# Altium footprint library lib_datalogger.PcbLib: 866 footprints (part 19 of 55)
Each footprint in its own frame and in the unit in brackets; x right, y up, seen from the top. Pads: shape width x height; smd on the part's side, far side on the other; paste and mask are expansions set on the pad; w line width, h text height; cw(c..) or ccw(c..) is an arc to the next point about the centre after c.
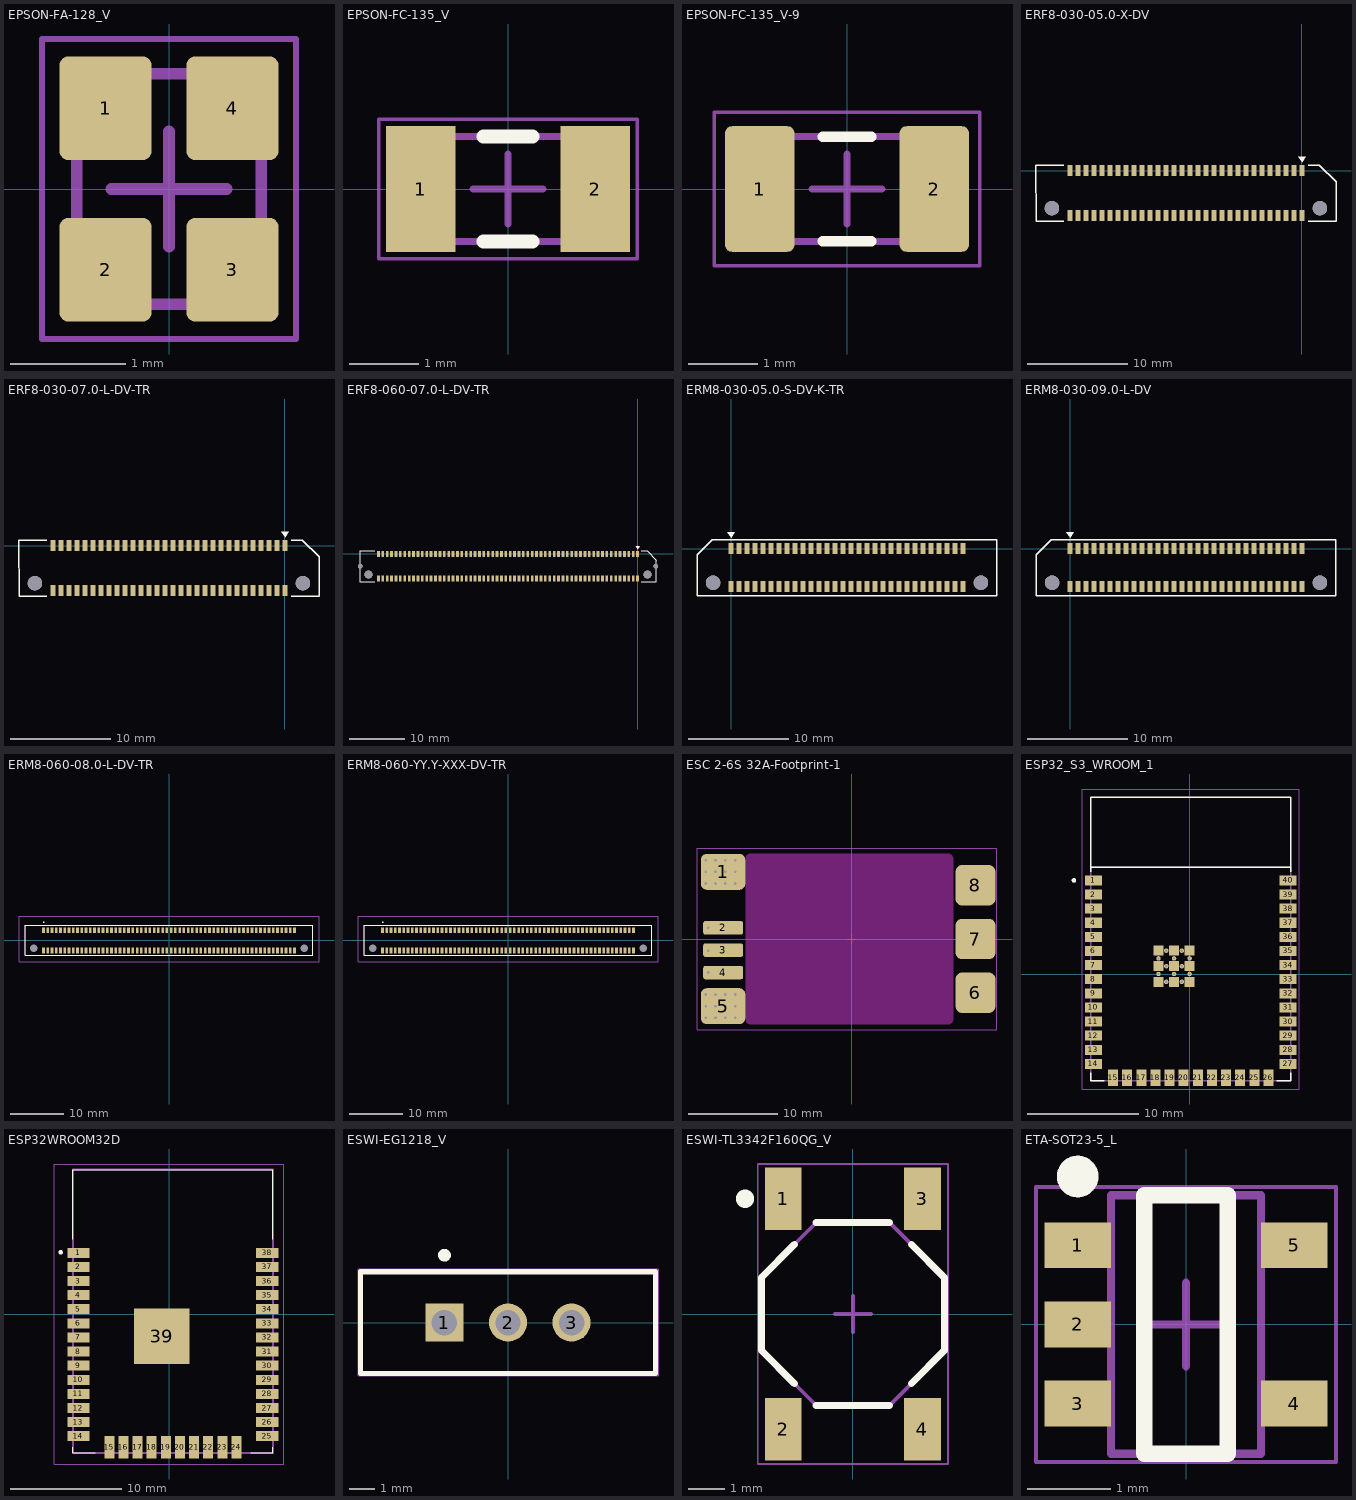
[diagram p18: the footprints below, top view; thin cyan lines are the x and y axes]

## EPSON-FA-128_V [mm] "SMD, 4-Leads, Body 2x1.6mm, Pitch 1.45mm"
height 0.5
pads (4):
  rrect20% 0.8x0.9 smd: 1(-0.55,0.7) 2(-0.55,-0.7) 3(0.55,-0.7) 4(0.55,0.7)
Mechanical 13:
  lines w0.1: -0.8,0.7 -0.5,1 ; -0.8,-1 0.8,-1 0.8,1 -0.8,1 -0.8,-1
Mechanical 15:
  lines w0.05: -1.1,-1.3 -1.1,1.3 1.1,1.3 1.1,-1.3 -1.1,-1.3
  lines w0.1: -0.5,0 0.5,0 ; 0,-0.5 0,0.5
Top Designator:
  text ".Designator" at -1.27,-0.127 h0.6
3D body "CX2016DB16000D0GPSC1.STEP": height 0.4, standoff 0, extent -0.8,-1 0.8,1

## EPSON-FC-135_V [mm] "SMD, 2-Leads, Body 3.2x1.5mm"
height 0.9
pads (2):
  rect 1x1.8 smd: 1(-1.25,0) 2(1.25,0)
Top Overlay:
  lines w0.2: -0.35,-0.75 0.35,-0.75 ; -0.35,0.75 0.35,0.75
Mechanical 13:
  lines w0.1: -1.6,-0.75 -1.6,0.75 1.6,0.75 1.6,-0.75 -1.6,-0.75
Mechanical 15:
  lines w0.05: -1.85,-1 -1.85,1 1.85,1 1.85,-1 -1.85,-1
  lines w0.1: -0.5,0 0.5,0 ; 0,-0.5 0,0.5
3D body: height 0.7, standoff 0, extent -1.6,-0.75 1.6,0.75
3D body: height 0.9, standoff 0, extent -1.45,-0.75 1.45,0.75

## EPSON-FC-135_V-9 [mm] "SMD, 2-Leads, Body 3.2x1.5mm"
height 0.9
pads (2):
  rrect20% 1x1.8 smd: 1(-1.25,0) 2(1.25,0)
Top Overlay:
  lines w0.15: -0.35,-0.75 0.35,-0.75 ; -0.35,0.75 0.35,0.75
Mechanical 13:
  lines w0.1: -1.6,-0.75 -1.6,0.75 1.6,0.75 1.6,-0.75 -1.6,-0.75
Mechanical 15:
  lines w0.05: -1.9,-1.1 1.9,-1.1 1.9,1.1 -1.9,1.1 -1.9,-1.1
  lines w0.1: -0.5,0 0.5,0 ; 0,-0.5 0,0.5
Top Designator:
  text ".Designator" at -1.27,-0.127 h0.6
3D body: height 0.7, standoff 0, extent -1.6,-0.75 1.6,0.75
3D body: height 0.9, standoff 0, extent -1.45,-0.75 1.45,0.75

## ERF8-030-05.0-X-DV [mm]
pads (62):
  rect 0.5x1.1 smd: 1(0,0) 2(0,-4.5) 3(-0.8,0) 4(-0.8,-4.5) 5(-1.6,0) 6(-1.6,-4.5) 7(-2.4,0) 8(-2.4,-4.5) 9(-3.2,0) 10(-3.2,-4.5) 11(-4,0) 12(-4,-4.5) 13(-4.8,0) 14(-4.8,-4.5) 15(-5.6,0) 16(-5.6,-4.5) 17(-6.4,0) 18(-6.4,-4.5) 19(-7.2,0) 20(-7.2,-4.5) 21(-8,0) 22(-8,-4.5) 23(-8.8,0) 24(-8.8,-4.5) 25(-9.6,0) 26(-9.6,-4.5) 27(-10.4,0) 28(-10.4,-4.5) 29(-11.2,0) 30(-11.2,-4.5) 31(-12,0) 32(-12,-4.5) 33(-12.8,0) 34(-12.8,-4.5) 35(-13.6,0) 36(-13.6,-4.5) 37(-14.4,0) 38(-14.4,-4.5) 39(-15.2,0) 40(-15.2,-4.5) 41(-16,0) 42(-16,-4.5) 43(-16.8,0) 44(-16.8,-4.5) 45(-17.6,0) 46(-17.6,-4.5) 47(-18.4,0) 48(-18.4,-4.5) 49(-19.2,0) 50(-19.2,-4.5) 51(-20,0) 52(-20,-4.5) 53(-20.8,0) 54(-20.8,-4.5) 55(-21.6,0) 56(-21.6,-4.5) 57(-22.4,0) 58(-22.4,-4.5) 59(-23.2,0) 60(-23.2,-4.5)
  round 1.45 hole 1.45 unplated: HOLE(-25,-3.75) HOLE(1.8,-3.75)
Top Overlay:
  region: 0.009,0.846 -0.379,1.389 0.397,1.389
  lines w0.127: -23.837,-5.05 -26.6,-5.05 -26.6,0.55 -23.838,0.55 ; 0.638,-5.05 3.4,-5.05 3.4,-1.107 1.743,0.55 0.638,0.55
3D body "Samtec-ERF8-030-05-L-DV.step": height 5.33, standoff -1.04, extent -26.6,-5.05 3.4,0.55

## ERF8-030-07.0-L-DV-TR [mm]
pads (62):
  rect 0.5x1.1 smd: 1(0,0) 2(0,-4.5) 3(-0.8,0) 4(-0.8,-4.5) 5(-1.6,0) 6(-1.6,-4.5) 7(-2.4,0) 8(-2.4,-4.5) 9(-3.2,0) 10(-3.2,-4.5) 11(-4,0) 12(-4,-4.5) 13(-4.8,0) 14(-4.8,-4.5) 15(-5.6,0) 16(-5.6,-4.5) 17(-6.4,0) 18(-6.4,-4.5) 19(-7.2,0) 20(-7.2,-4.5) 21(-8,0) 22(-8,-4.5) 23(-8.8,0) 24(-8.8,-4.5) 25(-9.6,0) 26(-9.6,-4.5) 27(-10.4,0) 28(-10.4,-4.5) 29(-11.2,0) 30(-11.2,-4.5) 31(-12,0) 32(-12,-4.5) 33(-12.8,0) 34(-12.8,-4.5) 35(-13.6,0) 36(-13.6,-4.5) 37(-14.4,0) 38(-14.4,-4.5) 39(-15.2,0) 40(-15.2,-4.5) 41(-16,0) 42(-16,-4.5) 43(-16.8,0) 44(-16.8,-4.5) 45(-17.6,0) 46(-17.6,-4.5) 47(-18.4,0) 48(-18.4,-4.5) 49(-19.2,0) 50(-19.2,-4.5) 51(-20,0) 52(-20,-4.5) 53(-20.8,0) 54(-20.8,-4.5) 55(-21.6,0) 56(-21.6,-4.5) 57(-22.4,0) 58(-22.4,-4.5) 59(-23.2,0) 60(-23.2,-4.5)
  round 1.45 hole 1.45 unplated: HOLE(-25,-3.75) HOLE(1.8,-3.75)
Top Overlay:
  region: 0.009,0.846 -0.379,1.389 0.397,1.389
  lines w0.127: -23.837,-5.05 -26.6,-5.05 -26.6,0.55 -23.838,0.55 ; 0.638,-5.05 3.4,-5.05 3.4,-1.107 1.743,0.55 0.638,0.55
3D body "Samtec-ERF8-030-07-L-DV.step": height 7.24, standoff -1.03, extent -26.651,-5.05 3.349,0.55

## ERF8-060-07.0-L-DV-TR [mm]
pads (124):
  rect 0.5x1.1 smd: 1(0,0) 2(0,-4.5) 3(-0.8,0) 4(-0.8,-4.5) 5(-1.6,0) 6(-1.6,-4.5) 7(-2.4,0) 8(-2.4,-4.5) 9(-3.2,0) 10(-3.2,-4.5) 11(-4,0) 12(-4,-4.5) 13(-4.8,0) 14(-4.8,-4.5) 15(-5.6,0) 16(-5.6,-4.5) 17(-6.4,0) 18(-6.4,-4.5) 19(-7.2,0) 20(-7.2,-4.5) 21(-8,0) 22(-8,-4.5) 23(-8.8,0) 24(-8.8,-4.5) 25(-9.6,0) 26(-9.6,-4.5) 27(-10.4,0) 28(-10.4,-4.5) 29(-11.2,0) 30(-11.2,-4.5) 31(-12,0) 32(-12,-4.5) 33(-12.8,0) 34(-12.8,-4.5) 35(-13.6,0) 36(-13.6,-4.5) 37(-14.4,0) 38(-14.4,-4.5) 39(-15.2,0) 40(-15.2,-4.5) 41(-16,0) 42(-16,-4.5) 43(-16.8,0) 44(-16.8,-4.5) 45(-17.6,0) 46(-17.6,-4.5) 47(-18.4,0) 48(-18.4,-4.5) 49(-19.2,0) 50(-19.2,-4.5) 51(-20,0) 52(-20,-4.5) 53(-20.8,0) 54(-20.8,-4.5) 55(-21.6,0) 56(-21.6,-4.5) 57(-22.4,0) 58(-22.4,-4.5) 59(-23.2,0) 60(-23.2,-4.5) 61(-24,0) 62(-24,-4.5) 63(-24.8,0) 64(-24.8,-4.5) 65(-25.6,0) 66(-25.6,-4.5) 67(-26.4,0) 68(-26.4,-4.5) 69(-27.2,0) 70(-27.2,-4.5) 71(-28,0) 72(-28,-4.5) 73(-28.8,0) 74(-28.8,-4.5) 75(-29.6,0) 76(-29.6,-4.5) 77(-30.4,0) 78(-30.4,-4.5) 79(-31.2,0) 80(-31.2,-4.5) 81(-32,0) 82(-32,-4.5) 83(-32.8,0) 84(-32.8,-4.5) 85(-33.6,0) 86(-33.6,-4.5) 87(-34.4,0) 88(-34.4,-4.5) 89(-35.2,0) 90(-35.2,-4.5) 91(-36,0) 92(-36,-4.5) 93(-36.8,0) 94(-36.8,-4.5) 95(-37.6,0) 96(-37.6,-4.5) 97(-38.4,0) 98(-38.4,-4.5) 99(-39.2,0) 100(-39.2,-4.5) 101(-40,0) 102(-40,-4.5) 103(-40.8,0) 104(-40.8,-4.5) 105(-41.6,0) 106(-41.6,-4.5) 107(-42.4,0) 108(-42.4,-4.5) 109(-43.2,0) 110(-43.2,-4.5) 111(-44,0) 112(-44,-4.5) 113(-44.8,0) 114(-44.8,-4.5) 115(-45.6,0) 116(-45.6,-4.5) 117(-46.4,0) 118(-46.4,-4.5) 119(-47.2,0) 120(-47.2,-4.5)
  round 0.83 hole 0.83 unplated: HOLE(-50.5,-2.25) HOLE(3.3,-2.25)
  round 1.45 hole 1.45 unplated: HOLE(-49,-3.75) HOLE(1.8,-3.75)
Top Overlay:
  region: 0.009,0.846 -0.379,1.389 0.397,1.389
  lines w0.127: -47.837,-5.05 -50.6,-5.05 -50.6,0.55 -47.838,0.55 ; 0.638,-5.05 3.4,-5.05 3.4,-1.107 1.743,0.55 0.638,0.55
3D body "Samtec-ERF8-060-07-L-DV.step": height 7.24, standoff -1.03, extent -50.6,-5.05 3.4,0.55

## ERM8-030-05.0-S-DV-K-TR [mm]
height 5
pads (62):
  rect 0.5x1.1 smd: 1(0,0) 2(0,-3.8) 3(0.8,0) 4(0.8,-3.8) 5(1.6,0) 6(1.6,-3.8) 7(2.4,0) 8(2.4,-3.8) 9(3.2,0) 10(3.2,-3.8) 11(4,0) 12(4,-3.8) 13(4.8,0) 14(4.8,-3.8) 15(5.6,0) 16(5.6,-3.8) 17(6.4,0) 18(6.4,-3.8) 19(7.2,0) 20(7.2,-3.8) 21(8,0) 22(8,-3.8) 23(8.8,0) 24(8.8,-3.8) 25(9.6,0) 26(9.6,-3.8) 27(10.4,0) 28(10.4,-3.8) 29(11.2,0) 30(11.2,-3.8) 31(12,0) 32(12,-3.8) 33(12.8,0) 34(12.8,-3.8) 35(13.6,0) 36(13.6,-3.8) 37(14.4,0) 38(14.4,-3.8) 39(15.2,0) 40(15.2,-3.8) 41(16,0) 42(16,-3.8) 43(16.8,0) 44(16.8,-3.8) 45(17.6,0) 46(17.6,-3.8) 47(18.4,0) 48(18.4,-3.8) 49(19.2,0) 50(19.2,-3.8) 51(20,0) 52(20,-3.8) 53(20.8,0) 54(20.8,-3.8) 55(21.6,0) 56(21.6,-3.8) 57(22.4,0) 58(22.4,-3.8) 59(23.2,0) 60(23.2,-3.8)
  round 1.45 hole 1.45 unplated: HOLE(-1.8,-3.4) HOLE(25,-3.4)
Top Overlay:
  region: 0.009,1.1 -0.379,1.643 0.397,1.643
  lines w0.127: -3.4,-4.7 26.6,-4.7 26.6,0.9 -1.896,0.9 -3.4,-0.605 -3.4,-4.7
3D body "Samtec-ERM8-030-05_0-S-DV-K.step": height 8.9, standoff -1.07, extent -3.4,-4.7 26.6,0.9

## ERM8-030-09.0-L-DV [mm]
height 9
pads (62):
  rect 0.5x1.1 smd: 1(0,0) 2(0,-3.8) 3(0.8,0) 4(0.8,-3.8) 5(1.6,0) 6(1.6,-3.8) 7(2.4,0) 8(2.4,-3.8) 9(3.2,0) 10(3.2,-3.8) 11(4,0) 12(4,-3.8) 13(4.8,0) 14(4.8,-3.8) 15(5.6,0) 16(5.6,-3.8) 17(6.4,0) 18(6.4,-3.8) 19(7.2,0) 20(7.2,-3.8) 21(8,0) 22(8,-3.8) 23(8.8,0) 24(8.8,-3.8) 25(9.6,0) 26(9.6,-3.8) 27(10.4,0) 28(10.4,-3.8) 29(11.2,0) 30(11.2,-3.8) 31(12,0) 32(12,-3.8) 33(12.8,0) 34(12.8,-3.8) 35(13.6,0) 36(13.6,-3.8) 37(14.4,0) 38(14.4,-3.8) 39(15.2,0) 40(15.2,-3.8) 41(16,0) 42(16,-3.8) 43(16.8,0) 44(16.8,-3.8) 45(17.6,0) 46(17.6,-3.8) 47(18.4,0) 48(18.4,-3.8) 49(19.2,0) 50(19.2,-3.8) 51(20,0) 52(20,-3.8) 53(20.8,0) 54(20.8,-3.8) 55(21.6,0) 56(21.6,-3.8) 57(22.4,0) 58(22.4,-3.8) 59(23.2,0) 60(23.2,-3.8)
  round 1.45 hole 1.45 unplated: HOLE(-1.8,-3.4) HOLE(25,-3.4)
Top Overlay:
  region: 0.009,1.1 -0.379,1.643 0.397,1.643
  lines w0.127: -3.4,-4.7 -3.4,-0.605 -1.896,0.9 26.6,0.9 26.6,-4.7 -3.4,-4.7
3D body "Samtec-ERM8-030-09_0-L-DV.step": height 12.9, standoff -1.07, extent -3.4,-4.7 26.6,0.9

## ERM8-060-08.0-L-DV-TR [mm]
pads (122):
  rect 0.5x1.1 smd: 1(-23.6,1.9) 2(-23.6,-1.9) 3(-22.8,1.9) 4(-22.8,-1.9) 5(-22,1.9) 6(-22,-1.9) 7(-21.2,1.9) 8(-21.2,-1.9) 9(-20.4,1.9) 10(-20.4,-1.9) 11(-19.6,1.9) 12(-19.6,-1.9) 13(-18.8,1.9) 14(-18.8,-1.9) 15(-18,1.9) 16(-18,-1.9) 17(-17.2,1.9) 18(-17.2,-1.9) 19(-16.4,1.9) 20(-16.4,-1.9) 21(-15.6,1.9) 22(-15.6,-1.9) 23(-14.8,1.9) 24(-14.8,-1.9) 25(-14,1.9) 26(-14,-1.9) 27(-13.2,1.9) 28(-13.2,-1.9) 29(-12.4,1.9) 30(-12.4,-1.9) 31(-11.6,1.9) 32(-11.6,-1.9) 33(-10.8,1.9) 34(-10.8,-1.9) 35(-10,1.9) 36(-10,-1.9) 37(-9.2,1.9) 38(-9.2,-1.9) 39(-8.4,1.9) 40(-8.4,-1.9) 41(-7.6,1.9) 42(-7.6,-1.9) 43(-6.8,1.9) 44(-6.8,-1.9) 45(-6,1.9) 46(-6,-1.9) 47(-5.2,1.9) 48(-5.2,-1.9) 49(-4.4,1.9) 50(-4.4,-1.9) 51(-3.6,1.9) 52(-3.6,-1.9) 53(-2.8,1.9) 54(-2.8,-1.9) 55(-2,1.9) 56(-2,-1.9) 57(-1.2,1.9) 58(-1.2,-1.9) 59(-0.4,1.9) 60(-0.4,-1.9) 61(0.4,1.9) 62(0.4,-1.9) 63(1.2,1.9) 64(1.2,-1.9) 65(2,1.9) 66(2,-1.9) 67(2.8,1.9) 68(2.8,-1.9) 69(3.6,1.9) 70(3.6,-1.9) 71(4.4,1.9) 72(4.4,-1.9) 73(5.2,1.9) 74(5.2,-1.9) 75(6,1.9) 76(6,-1.9) 77(6.8,1.9) 78(6.8,-1.9) 79(7.6,1.9) 80(7.6,-1.9) 81(8.4,1.9) 82(8.4,-1.9) 83(9.2,1.9) 84(9.2,-1.9) 85(10,1.9) 86(10,-1.9) 87(10.8,1.9) 88(10.8,-1.9) 89(11.6,1.9) 90(11.6,-1.9) 91(12.4,1.9) 92(12.4,-1.9) 93(13.2,1.9) 94(13.2,-1.9) 95(14,1.9) 96(14,-1.9) 97(14.8,1.9) 98(14.8,-1.9) 99(15.6,1.9) 100(15.6,-1.9) 101(16.4,1.9) 102(16.4,-1.9) 103(17.2,1.9) 104(17.2,-1.9) 105(18,1.9) 106(18,-1.9) 107(18.8,1.9) 108(18.8,-1.9) 109(19.6,1.9) 110(19.6,-1.9) 111(20.4,1.9) 112(20.4,-1.9) 113(21.2,1.9) 114(21.2,-1.9) 115(22,1.9) 116(22,-1.9) 117(22.8,1.9) 118(22.8,-1.9) 119(23.6,1.9) 120(23.6,-1.9)
  round 0.725 hole 1.45 unplated: 121(-25.4,-1.5) 122(25.4,-1.5)
Top Overlay:
  circle w0.2: c-23.55,3.4 r0.05
  lines w0.1: -27,-2.8 27,-2.8 27,2.8 -27,2.8 -27,-2.8
Mechanical 13:
  lines w0.2: -27,-2.8 27,-2.8 27,2.8 -27,2.8 -27,-2.8
Mechanical 15:
  lines w0.05: -28.2,-4 28.2,-4 28.2,4.5 -28.2,4.5 -28.2,-4
3D body "ERM8-060-08.0-X-DV.step": height 11.8, standoff -1.18, extent -27.076,-2.8 26.924,2.8

## ERM8-060-YY.Y-XXX-DV-TR [mm]
pads (122):
  rect 0.5x1.1 smd: 1(-23.6,1.9) 2(-23.6,-1.9) 3(-22.8,1.9) 4(-22.8,-1.9) 5(-22,1.9) 6(-22,-1.9) 7(-21.2,1.9) 8(-21.2,-1.9) 9(-20.4,1.9) 10(-20.4,-1.9) 11(-19.6,1.9) 12(-19.6,-1.9) 13(-18.8,1.9) 14(-18.8,-1.9) 15(-18,1.9) 16(-18,-1.9) 17(-17.2,1.9) 18(-17.2,-1.9) 19(-16.4,1.9) 20(-16.4,-1.9) 21(-15.6,1.9) 22(-15.6,-1.9) 23(-14.8,1.9) 24(-14.8,-1.9) 25(-14,1.9) 26(-14,-1.9) 27(-13.2,1.9) 28(-13.2,-1.9) 29(-12.4,1.9) 30(-12.4,-1.9) 31(-11.6,1.9) 32(-11.6,-1.9) 33(-10.8,1.9) 34(-10.8,-1.9) 35(-10,1.9) 36(-10,-1.9) 37(-9.2,1.9) 38(-9.2,-1.9) 39(-8.4,1.9) 40(-8.4,-1.9) 41(-7.6,1.9) 42(-7.6,-1.9) 43(-6.8,1.9) 44(-6.8,-1.9) 45(-6,1.9) 46(-6,-1.9) 47(-5.2,1.9) 48(-5.2,-1.9) 49(-4.4,1.9) 50(-4.4,-1.9) 51(-3.6,1.9) 52(-3.6,-1.9) 53(-2.8,1.9) 54(-2.8,-1.9) 55(-2,1.9) 56(-2,-1.9) 57(-1.2,1.9) 58(-1.2,-1.9) 59(-0.4,1.9) 60(-0.4,-1.9) 61(0.4,1.9) 62(0.4,-1.9) 63(1.2,1.9) 64(1.2,-1.9) 65(2,1.9) 66(2,-1.9) 67(2.8,1.9) 68(2.8,-1.9) 69(3.6,1.9) 70(3.6,-1.9) 71(4.4,1.9) 72(4.4,-1.9) 73(5.2,1.9) 74(5.2,-1.9) 75(6,1.9) 76(6,-1.9) 77(6.8,1.9) 78(6.8,-1.9) 79(7.6,1.9) 80(7.6,-1.9) 81(8.4,1.9) 82(8.4,-1.9) 83(9.2,1.9) 84(9.2,-1.9) 85(10,1.9) 86(10,-1.9) 87(10.8,1.9) 88(10.8,-1.9) 89(11.6,1.9) 90(11.6,-1.9) 91(12.4,1.9) 92(12.4,-1.9) 93(13.2,1.9) 94(13.2,-1.9) 95(14,1.9) 96(14,-1.9) 97(14.8,1.9) 98(14.8,-1.9) 99(15.6,1.9) 100(15.6,-1.9) 101(16.4,1.9) 102(16.4,-1.9) 103(17.2,1.9) 104(17.2,-1.9) 105(18,1.9) 106(18,-1.9) 107(18.8,1.9) 108(18.8,-1.9) 109(19.6,1.9) 110(19.6,-1.9) 111(20.4,1.9) 112(20.4,-1.9) 113(21.2,1.9) 114(21.2,-1.9) 115(22,1.9) 116(22,-1.9) 117(22.8,1.9) 118(22.8,-1.9) 119(23.6,1.9) 120(23.6,-1.9)
  round 0.725 hole 1.45 unplated: 121(-25.4,-1.5) 122(25.4,-1.5)
Top Overlay:
  circle w0.2: c-23.55,3.4 r0.05
  lines w0.1: -27,-2.8 -27,2.8 27,2.8 27,-2.8 -27,-2.8
Mechanical 13:
  lines w0.2: -27,-2.8 -27,2.8 27,2.8 27,-2.8 -27,-2.8
Mechanical 15:
  lines w0.05: -28.2,-4 -28.2,4.5 28.2,4.5 28.2,-4 -28.2,-4

## ESC 2-6S 32A-Footprint-1 [mm]
pads (8):
  rrect30% 4.95x4 smd: 1(-14.35,7.5) 5(-14.35,-7.5)
  rrect30% 4.45x1.5 smd: 2(-14.35,1.25) 3(-14.35,-1.25) 4(-14.35,-3.75)
  rrect30% 4.45x4.5 smd: 6(13.85,-6) 7(13.85,0) 8(13.85,6)
via -16,-3.75 diameter 0.6 hole 0.3
via -16,-1.3 diameter 0.6 hole 0.3
via -16,1.25 diameter 0.6 hole 0.3
via -14.1,-7.5 diameter 0.6 hole 0.3
via -15.2,-7.5 diameter 0.6 hole 0.3
via -16.3,-7.5 diameter 0.6 hole 0.3
via -13,-7.5 diameter 0.6 hole 0.3
via -14.1,-8.8 diameter 0.6 hole 0.3
via -15.2,-8.8 diameter 0.6 hole 0.3
via -16.3,-8.8 diameter 0.6 hole 0.3
via -13,-8.8 diameter 0.6 hole 0.3
via -13,-6.2 diameter 0.6 hole 0.3
via -16.3,-6.2 diameter 0.6 hole 0.3
via -15.2,-6.2 diameter 0.6 hole 0.3
via -14.1,-6.2 diameter 0.6 hole 0.3
via -14.1,8.8 diameter 0.6 hole 0.3
via -15.2,8.8 diameter 0.6 hole 0.3
via -16.3,8.8 diameter 0.6 hole 0.3
via -13,8.8 diameter 0.6 hole 0.3
via -13,6.2 diameter 0.6 hole 0.3
via -16.3,6.2 diameter 0.6 hole 0.3
via -15.2,6.2 diameter 0.6 hole 0.3
via -14.1,6.2 diameter 0.6 hole 0.3
via -13,7.5 diameter 0.6 hole 0.3
via -16.3,7.5 diameter 0.6 hole 0.3
via -15.2,7.5 diameter 0.6 hole 0.3
via -14.1,7.5 diameter 0.6 hole 0.3
Keep-Out Layer:
  board cut-out: -11.35,9.5 10.85,9.5 10.949,9.5 11.133,9.424 11.274,9.283 11.35,9.1 11.35,9 11.35,-9 11.35,-9.1 11.274,-9.283 11.133,-9.424 10.949,-9.5 10.85,-9.5 -11.35,-9.5 -11.449,-9.5 -11.633,-9.424 -11.774,-9.283 -11.85,-9.099 -11.85,-9 -11.85,9 -11.85,9.099 -11.774,9.283 -11.633,9.424 -11.449,9.5
Mechanical 15:
  lines w0.05: -0.508,0 0,0 ; 0,-0.508 0,0 ; 0,0.508 0,0 ; 0.508,0 0,0 ; -17.272,-10.16 -17.272,10.16 16.256,10.16 16.256,-10.16 -17.272,-10.16
Top Designator:
  text ".Designator" at -1.397,0 h0.6
3D body "KISS_ESC_24A_WO_WIIRE.STEP": height 3.3, standoff -1.8, extent -13.5,-9.9 13.5,9.9

## ESP32_S3_WROOM_1 [mm] "Footprint for ESP32-S3-WROOM-1 module"
pads (61):
  rect 1.5x0.9 smd: 1(-8.65,8.42) 2(-8.65,7.15) 3(-8.65,5.88) 4(-8.65,4.61) 5(-8.65,3.34) 6(-8.65,2.07) 7(-8.65,0.8) 8(-8.65,-0.47) 9(-8.65,-1.74) 10(-8.65,-3.01) 11(-8.65,-4.28) 12(-8.65,-5.55) 13(-8.65,-6.82) 14(-8.65,-8.09) 27(8.85,-8.09) 28(8.85,-6.82) 29(8.85,-5.55) 30(8.85,-4.28) 31(8.85,-3.01) 32(8.85,-1.74) 33(8.85,-0.47) 34(8.85,0.8) 35(8.85,2.07) 36(8.85,3.34) 37(8.85,4.61) 38(8.85,5.88) 39(8.85,7.15) 40(8.85,8.42)
  rect 0.9x1.5 smd: 15(-6.885,-9.34) 16(-5.615,-9.34) 17(-4.345,-9.34) 18(-3.075,-9.34) 19(-1.805,-9.34) 20(-0.535,-9.34) 21(0.735,-9.34) 22(2.005,-9.34) 23(3.275,-9.34) 24(4.545,-9.34) 25(5.815,-9.34) 26(7.085,-9.34)
  rect 0.9x0.9 smd: 41[1...9](-2.8,-0.7) 41[1...9](-2.8,0.7) 41[1...9](-2.8,2.1) 41[1...9](-1.4,-0.7) 41[1...9](-1.4,0.7) 41[1...9](-1.4,2.1) 41[1...9](0,-0.7) 41[1...9](0,0.7) 41[1...9](0,2.1)
  round 0.4 hole 0.2 mask+0: 41[1...9](-2.8,0) 41[1...9](-2.8,1.4) 41[1...9](-2.1,-0.7) 41[1...9](-2.1,0.7) 41[1...9](-2.1,2.1) 41[1...9](-1.4,0) 41[1...9](-1.4,1.4) 41[1...9](-0.7,-0.7) 41[1...9](-0.7,0.7) 41[1...9](-0.7,2.1) 41[1...9](0,0) 41[1...9](0,1.4)
Top Overlay:
  circle w0.2: c-10.4,8.42 r0.1
  lines w0.127: -8.9,-8.86 -8.9,-9.59 -7.655,-9.59 ; -8.9,9.19 -8.9,9.61 ; 7.855,-9.59 9.1,-9.59 9.1,-8.86 ; 9.1,9.19 9.1,9.61 ; -8.9,9.61 -8.9,15.875 9.1,15.875 9.1,9.61 ; -8.9,9.61 9.1,9.61
Mechanical 13:
  circle w0.2: c-10.4,8.42 r0.1
  lines w0.127: -8.9,-9.59 -8.9,9.61 9.1,9.61 9.1,-9.59 -8.9,-9.59
Mechanical 15:
  lines w0.05: -9.65,-10.34 9.85,-10.34 9.85,16.637 -9.65,16.637 -9.65,-10.34
3D body "ESP32-S3-WROOM-1_20211021_0.STEP": height 3.1, standoff 0, extent -8.89,-9.652 9.11,15.848

## ESP32WROOM32D [mm]
pads (39):
  rect 2x0.9 smd: 1(-8.15,5.51) 2(-8.15,4.24) 3(-8.15,2.97) 4(-8.15,1.7) 5(-8.15,0.43) 6(-8.15,-0.84) 7(-8.15,-2.11) 8(-8.15,-3.38) 9(-8.15,-4.65) 10(-8.15,-5.92) 11(-8.15,-7.19) 12(-8.15,-8.46) 13(-8.15,-9.73) 14(-8.15,-11) 25(8.85,-11) 26(8.85,-9.73) 27(8.85,-8.46) 28(8.85,-7.19) 29(8.85,-5.92) 30(8.85,-4.65) 31(8.85,-3.38) 32(8.85,-2.11) 33(8.85,-0.84) 34(8.85,0.43) 35(8.85,1.7) 36(8.85,2.97) 37(8.85,4.24) 38(8.85,5.51)
  rect 0.9x2 smd: 15(-5.365,-12) 16(-4.095,-12) 17(-2.825,-12) 18(-1.555,-12) 19(-0.285,-12) 20(0.985,-12) 21(2.255,-12) 22(3.525,-12) 23(4.795,-12) 24(6.065,-12)
  rect 5x5 smd: 39(-0.65,-1.99)
Top Overlay:
  lines w0.1: -8.65,-12 -8.65,-12.5 -6.65,-12.5 ; -8.65,6.75 -8.65,13 9.35,13 9.35,6.75 ; 7.35,-12.5 9.35,-12.5 9.35,-12
  lines w0.2: -9.75,5.45 ccw(c-9.75,5.55) -9.75,5.65 ccw(c-9.75,5.55) -9.75,5.45
Mechanical 13:
  lines w0.2: -8.65,-12.5 9.35,-12.5 9.35,13 -8.65,13 -8.65,-12.5
Mechanical 15:
  lines w0.1: -10.35,-13.5 10.35,-13.5 10.35,13.5 -10.35,13.5 -10.35,-13.5
3D body "User Library-esp-wroom-32.STEP": height 3, standoff -0.04, extent -8.7,-12.57 9.37,12.97

## ESWI-EG1218_V [mm] "THD, 3-Leads, Body 11.6x4mm, Pitch 2.5mm"
height 7.4
pads (3):
  rect 1.5x1.5 hole 1: 1(-2.5,0)
  round 1.5 hole 1: 2(0,0) 3(2.5,0)
Top Overlay:
  circle w0.25: c-2.5,2.65 r0.125
  lines w0.2: -5.8,-2 -5.8,2 5.8,2 5.8,-2 -5.8,-2
Mechanical 13:
  lines w0.1: -5.8,-2 -5.8,2 5.8,2 5.8,-2 -5.8,-2
Mechanical 15:
  lines w0.05: -5.9,-2.1 -5.9,2.1 5.9,2.1 5.9,-2.1 -5.9,-2.1
  lines w0.1: -0.5,0 0.5,0 ; 0,-0.5 0,0.5
3D body "User Library-EG1218.STEP": height 7.4, standoff -4.7, extent -5.8,-2 5.8,2

## ESWI-TL3342F160QG_V [mm] "SMD, 4-Leads, Body 5x5mm, Pitch 6.3mm"
height 1.5
pads (4):
  rect 1x1.7 smd: 1(-1.9,3.15) 2(-1.9,-3.15) 3(1.9,3.15) 4(1.9,-3.15)
Top Overlay:
  circle w0.25: c-2.95,3.15 r0.125
  lines w0.2: -1.6,-1.9 -2.5,-1 -2.5,1 -1.6,1.9 ; -1,-2.5 1,-2.5 ; -1,2.5 1,2.5 ; 1.6,-1.9 2.5,-1 2.5,1 1.6,1.9
Mechanical 13:
  lines w0.1: -2.5,-1 -2.5,1 -1,2.5 1,2.5 2.5,1 2.5,-1 1,-2.5 -1,-2.5 -2.5,-1
Mechanical 15:
  lines w0.05: -2.6,-4.1 -2.6,4.1 2.6,4.1 2.6,-4.1 -2.6,-4.1
  lines w0.1: -0.5,0 0.5,0 ; 0,-0.5 0,0.5
3D body: height 1.2, standoff 0.8, extent -1.899,-1.899 1.899,1.899
3D body: height 1.5, standoff 1.2, extent -0.999,-0.999 0.999,0.999
3D body: height 0.8, standoff 0, extent -2.5,-2.5 2.5,2.5

## ETA-SOT23-5_L [mm] "SOT23, 5-Leads, Body 3.1x1.8mm, Pitch 0.95mm, IPC High Density"
height 1.36
pads (5):
  rect 0.8x0.55 smd: 1(-1.3,0.95) 2(-1.3,0) 3(-1.3,-0.95) 4(1.3,-0.95) 5(1.3,0.95)
Top Overlay:
  circle w0.25: c-1.3,1.775 r0.125
  lines w0.2: -0.5,-1.55 -0.5,1.55 0.5,1.55 0.5,-1.55 -0.5,-1.55
Mechanical 13:
  lines w0.1: -0.9,-1.55 0.9,-1.55 0.9,1.55 -0.9,1.55 -0.9,-1.55
Mechanical 15:
  lines w0.05: -1.8,-1.65 1.8,-1.65 1.8,1.65 -1.8,1.65 -1.8,-1.65
  lines w0.1: -0.5,0 0.5,0 ; 0,-0.5 0,0.5
3D body "SOT95P280X136-5L.step": height 1.36, standoff 0, extent -1.55,-1.55 1.55,1.55